# Altium footprint library microbuilder.PCBLIB: 422 footprints (part 17 of 27)
Each footprint in its own frame and in the unit in brackets; x right, y up, seen from the top. Pads: shape width x height; smd on the part's side, far side on the other; paste and mask are expansions set on the pad; w line width, h text height; cw(c..) or ccw(c..) is an arc to the next point about the centre after c.
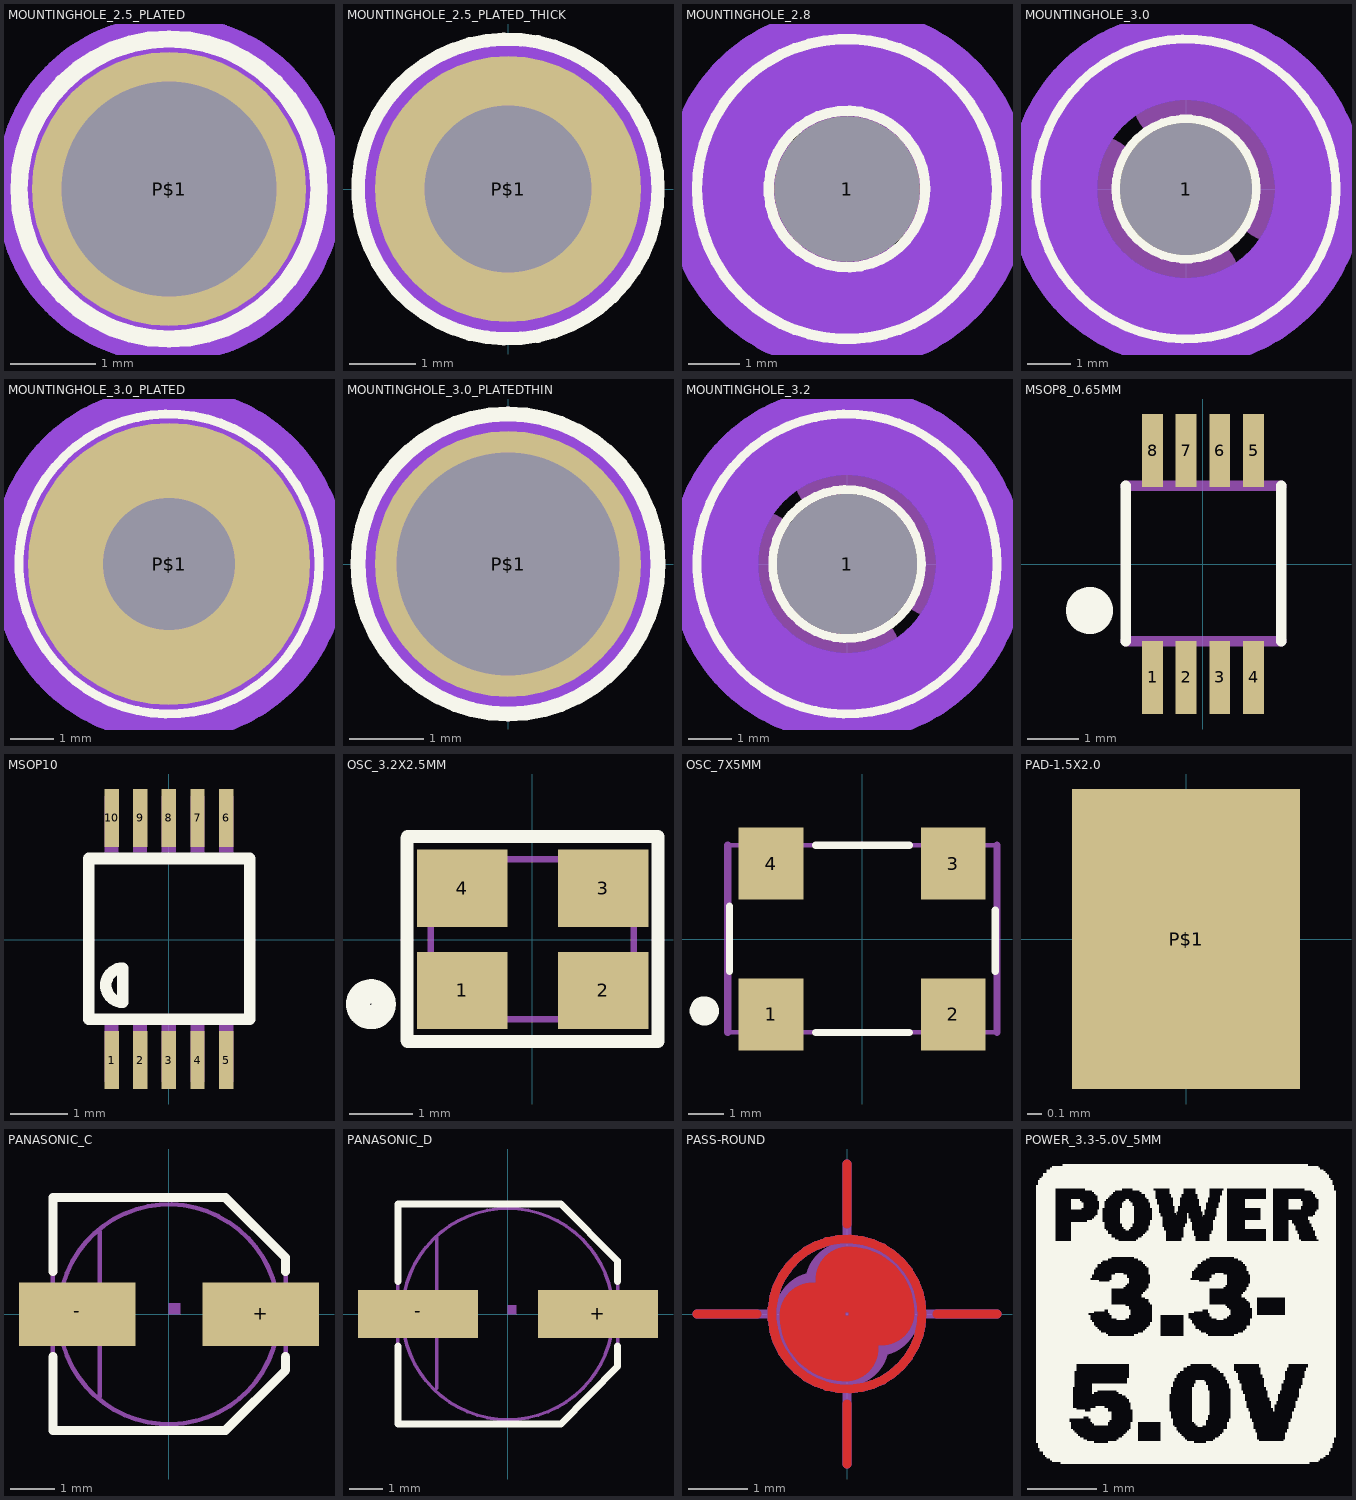
[diagram p16: the footprints below, top view; thin cyan lines are the x and y axes]

## MOUNTINGHOLE_2.5_PLATED [mil]
pads (1):
  round 126 hole 99: P$1(0,0)
Top Layer keep-out:
  circle w80: c0,0 r40
Bottom Layer keep-out:
  circle w80: c0,0 r40
Top Overlay:
  circle w8: c0,0 r69
Mechanical 27:
  circle w80: c0,0 r40
Mechanical 28:
  circle w80: c0,0 r40

## MOUNTINGHOLE_2.5_PLATED_THICK [mil]
pads (1):
  round 158 hole 99: P$1(0,0)
Top Layer keep-out:
  circle w80: c0,0 r50
Bottom Layer keep-out:
  circle w80: c0,0 r50
Top Overlay:
  circle w8: c0,0 r89
Mechanical 27:
  circle w80: c0,0 r50
Mechanical 28:
  circle w80: c0,0 r50

## MOUNTINGHOLE_2.8 [mil]
pads (1):
  round 111 hole 111: 1(0,0)
Top Layer keep-out:
  circle w80: c0,0 r100
Bottom Layer keep-out:
  circle w80: c0,0 r100
Top Overlay:
  circle w8: c0,0 r115
  circle w8: c0,0 r60
Mechanical 16:
  circle w18: c0,0 r25
  lines w90: -70,0 ccw(c0,0) 0,-70 ; 0,70 cw(c0,0) 70,0
Via Holes:
  circle w80: c0,0 r100
Mechanical 27:
  circle w80: c0,0 r100
Mechanical 28:
  circle w80: c0,0 r100

## MOUNTINGHOLE_3.0 [mil]
pads (1):
  round 119 hole 119: 1(0,0)
Top Layer keep-out:
  circle w80: c0,0 r120
Bottom Layer keep-out:
  circle w80: c0,0 r120
Top Overlay:
  circle w8: c0,0 r135
  circle w8: c0,0 r63
Mechanical 13:
  text "3,0" at -50,-150 h77.5
Mechanical 16:
  circle w18: c0,0 r30
  lines w98: -85,0 ccw(c0,0) 0,-85 ; 0,85 cw(c0,0) 85,0
Via Holes:
  circle w80: c0,0 r120
Mechanical 27:
  circle w80: c0,0 r120
Mechanical 28:
  circle w80: c0,0 r120

## MOUNTINGHOLE_3.0_PLATED [mil]
pads (1):
  round 254 hole 119: P$1(0,0)
Top Layer keep-out:
  circle w80: c0,0 r120
Bottom Layer keep-out:
  circle w80: c0,0 r120
Top Overlay:
  circle w8: c0,0 r135
Mechanical 13:
  text "3,0" at -50,-150 h77.5
Mechanical 16:
  circle w18: c0,0 r30
  lines w98: -85,0 ccw(c0,0) 0,-85 ; 0,85 cw(c0,0) 85,0
Via Holes:
  circle w80: c0,0 r120
Mechanical 27:
  circle w80: c0,0 r120
Mechanical 28:
  circle w80: c0,0 r120

## MOUNTINGHOLE_3.0_PLATEDTHIN [mil]
pads (1):
  round 142 hole 119: P$1(0,0)
Top Layer keep-out:
  circle w80: c0,0 r40
Bottom Layer keep-out:
  circle w80: c0,0 r40
Top Overlay:
  circle w8: c0,0 r80
Mechanical 13:
  text "3,0" at -34.25,-107.87 h49.6
Via Holes:
  circle w80: c0,0 r40
Mechanical 27:
  circle w80: c0,0 r40
Mechanical 28:
  circle w80: c0,0 r40

## MOUNTINGHOLE_3.2 [mil]
pads (1):
  round 126 hole 126: 1(0,0)
Top Layer keep-out:
  circle w80: c0,0 r120
Bottom Layer keep-out:
  circle w80: c0,0 r120
Top Overlay:
  circle w8: c0,0 r135
  circle w8: c0,0 r67
Mechanical 16:
  circle w18: c0,0 r30
  lines w98: -85,0 ccw(c0,0) 0,-85 ; 0,85 cw(c0,0) 85,0
Via Holes:
  circle w80: c0,0 r120
Mechanical 27:
  circle w80: c0,0 r120
Mechanical 28:
  circle w80: c0,0 r120

## MSOP8_0.65MM [mil]
pads (8):
  rect 16x56 smd: 1(-38.39,-86.61) 2(-12.8,-86.61) 3(13,-86.61) 4(39,-86.61) 5(39,87) 6(13,87) 7(-12.8,87) 8(-38.39,87)
Top Overlay:
  circle w24: c-86.61,-35.43 r6
  lines w8: -59.06,-59.06 -59.06,60 ; 60,-59.06 60,60
Mechanical 16:
  lines w5: -59.06,-59.06 -59.06,60 ; 60,-59.06 60,60
  lines w8: -59.06,-59.06 60,-59.06 ; -59.06,60 60,60

## MSOP10 [mil]
pads (10):
  rect 10x40 smd: 1(-39.37,-83.19) 2(-19.68,-83.19) 3(0,-83.19) 4(20,-83.19) 5(40,-83.19) 6(40,84) 7(20,84) 8(0,84) 9(-19.68,84) 10(-39.37,84)
Top Overlay:
  lines w8: -55.12,-55.12 56,-55.12 56,56 -55.12,56 -55.12,-55.12 ; -31.5,-43.31 cw(c-31.5,-31.5) -31.5,-19.68 -31.5,-43.31
Mechanical 16:
  rectangle: -44.27,-98.43 -34.43,-59.06
  rectangle: -24.58,-98.43 -14.74,-59.06
  rectangle: -4.9,-98.43 5,-59.06
  rectangle: 15,-98.43 25,-59.06
  rectangle: 35,-98.43 45,-59.06
  region: 45,99 35,99 35,60 45,60
  region: 25,99 15,99 15,60 25,60
  region: 5,99 -4.94,99 -4.94,60 5,60
  region: -14.79,99 -24.63,99 -24.63,60 -14.79,60
  region: -34.47,99 -44.31,99 -44.31,60 -34.47,60

## OSC_3.2X2.5MM [mil]
pads (4):
  rect 56x48 smd: 1(-43.31,-31.5) 2(44,-31.5) 3(44,32) 4(-43.31,32)
Top Overlay:
  circle w15: c-100,-40 r8
  lines w8: -77.5,-62.5 -77.5,63 ; -77.34,-63.15 78,-63.15 ; -77.34,64 78,64 ; 78,-62.5 78,63
Mechanical 16:
  lines w4: -62.99,-41.34 -62.99,42 ccw(c-59.06,46) -55.12,50 56,50 ccw(c59.5,46) 63,42 63,-41.34 ccw(c59.5,-45.28) 56,-49.21 -55.12,-49.21 ccw(c-59.06,-45.28) -62.99,-41.34

## OSC_7X5MM [mil]
pads (4):
  rect 71x79 smd: 1(-100,-82.68) 2(100,-82.68) 3(100,83) 4(-100,83)
Top Overlay:
  circle w16: c-173.23,-78.74 r8
  lines w8: -145.67,-35.43 -145.67,36 ; -51.18,-102.36 52,-102.36 ; -51.18,103 52,103 ; 146,-35.43 146,32
Mechanical 16:
  lines w5: -147.64,-102.36 148,-102.36 ; -147.64,103 148,103
  lines w8: -147.64,-102.36 -147.64,103 ; 148,-102.36 148,103

## PAD-1.5X2.0 [mil]
pads (1):
  rect 60x79 smd: P$1(0,0)

## PANASONIC_C [mil]
pads (2):
  rect 103x56 smd: +(81,0) -(-80.71,0)
Top Overlay:
  lines w8: -102.36,-37.4 -102.36,-102.36 50,-102.36 103,-49.21 103,-37.4 ; -102.36,38 -102.36,103 50,103 103,50 103,38
Mechanical 16:
  circle w4: c0,0 r97
  rectangle: -116.14,-13.78 -94.49,14
  rectangle: 95,-13.78 117,14
  region: 0,0 10,0 10,10 0,10
  lines w4: -61.02,-72.83 -61.02,73 ; -102.36,-102.36 50,-102.36 103,-49.21 103,50 50,103 -102.36,103 -102.36,-102.36

## PANASONIC_D [mil]
pads (2):
  rect 140x56 smd: +(105,0) -(-104.49,0)
Top Overlay:
  lines w8: -127.95,-37.4 -127.95,-127.95 62,-127.95 128,-61.02 128,-37.4 ; -127.95,38 -127.95,128 62,128 128,62 128,38
Mechanical 16:
  circle w4: c0,0 r123
  rectangle: -143.7,-13.78 -120.08,14
  rectangle: 121,-13.78 144,14
  region: 0,0 10,0 10,10 0,10
  lines w4: -82.68,-86.61 -82.68,89 ; -127.95,-127.95 62,-127.95 128,-61.02 128,62 62,128 -127.95,128 -127.95,-127.95

## PASS-ROUND [mil]
Top Layer:
  circle w6: c0,0 r50
  lines w6: -100,0 -60,0 ; 0,-100 0,-60 ; 0,60 0,100 ; 60,0 100,0
  lines w44: -23,-1 ccw(c-1,-1) -1,-23 ; 1,23 cw(c1,1) 23,1
Bottom Layer:
  circle w6: c0,0 r50
  lines w6: -100,0 -60,0 ; 0,-100 0,-60 ; 0,60 0,100 ; 60,0 100,0
  lines w44: -23,-1 ccw(c-1,-1) -1,-23 ; 1,23 cw(c1,1) 23,1
Top Solder:
  circle w0: c0,0 r100
Bottom Solder:
  circle w0: c0,0 r100
Mechanical 14:
  circle w6: c0,0 r50
  circle w6: c0,0 r50
  lines w6: -100,0 -50,0 ; 0,-100 0,-50 ; 0,50 0,100 ; 50,0 100,0
  lines w56: -20,0 ccw(c0,0) 0,-20 cw(c0,0) -20,0 ; 0,20 cw(c0,0) 20,0 ccw(c0,0) 0,20

## POWER_3.3-5.0V_5MM [mil]
Top Overlay:
  drawing of 1141 lines, arcs and shapes, not listed